# Altium footprint library PCB_CONNECTORS.PcbLib: 676 footprints (part 27 of 43)
Each footprint in its own frame and in the unit in brackets; x right, y up, seen from the top. Pads: shape width x height; smd on the part's side, far side on the other; paste and mask are expansions set on the pad; w line width, h text height; cw(c..) or ccw(c..) is an arc to the next point about the centre after c.
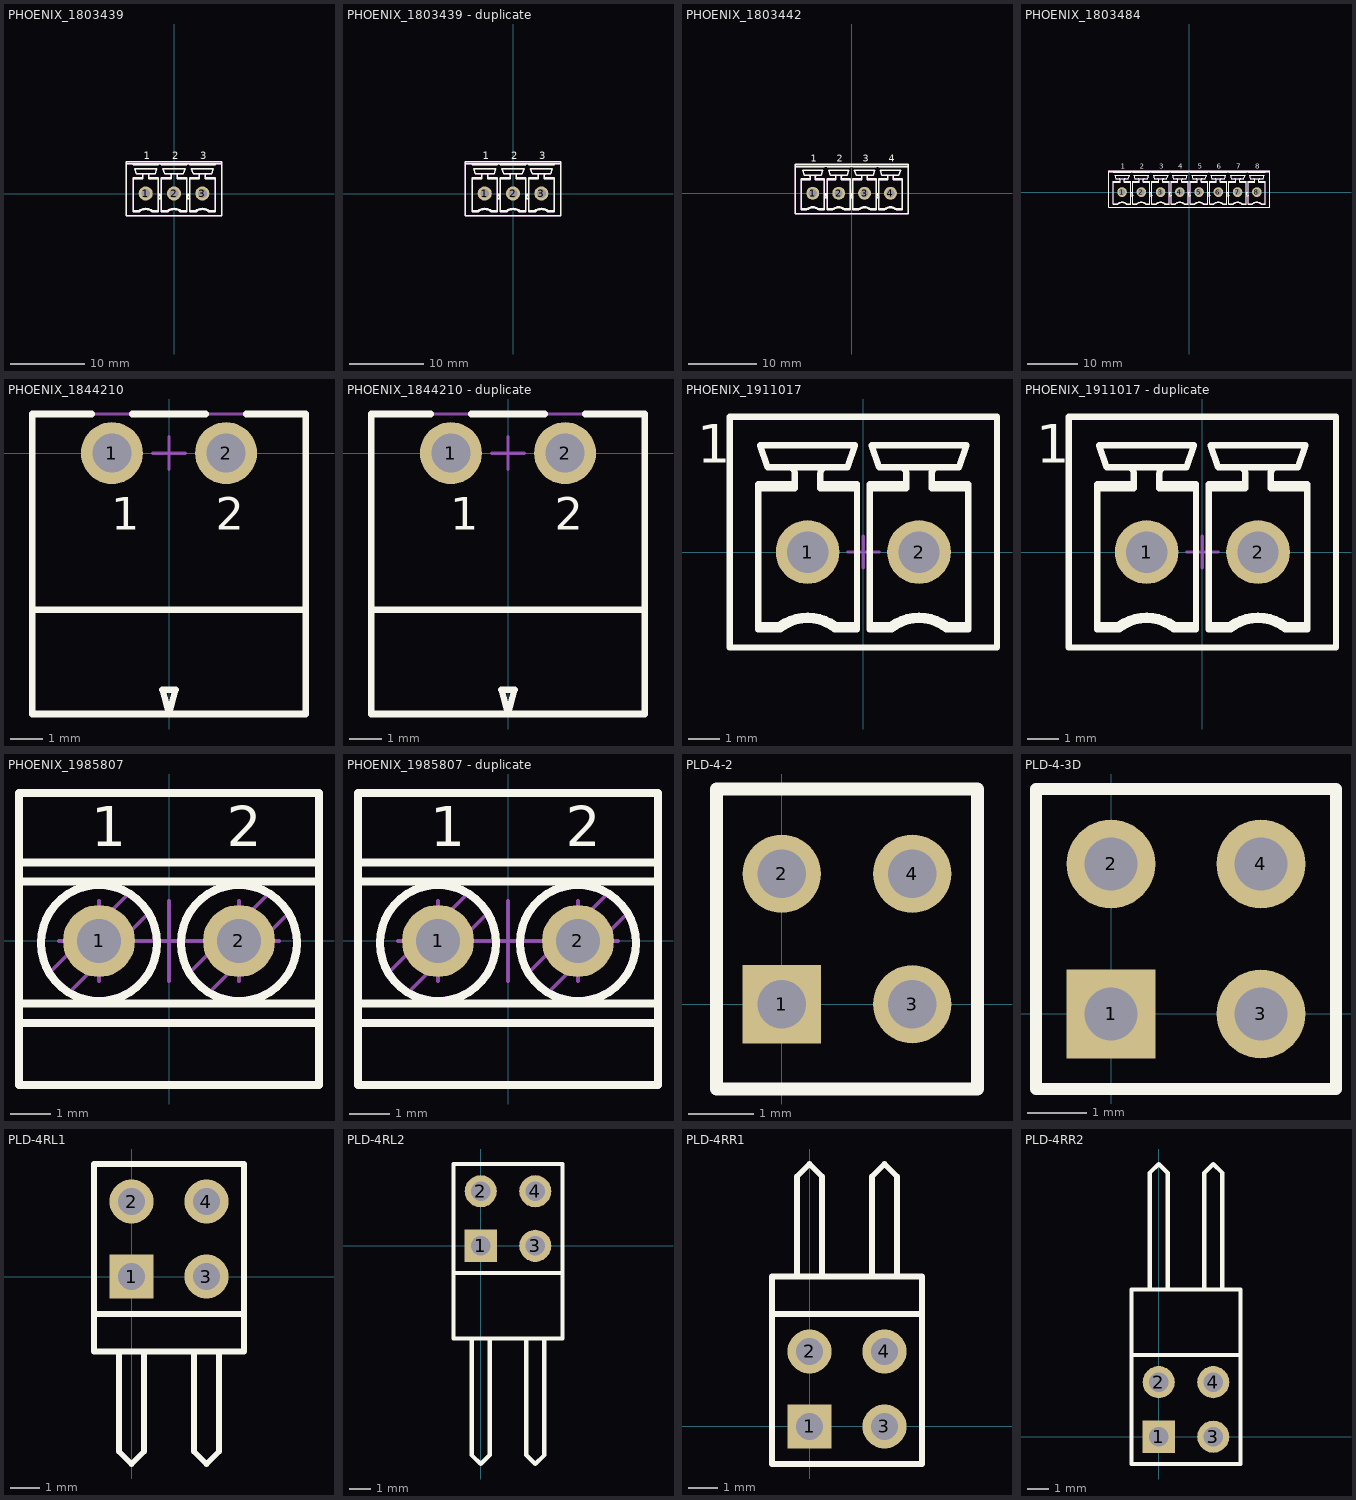
[diagram p26: the footprints below, top view; thin cyan lines are the x and y axes]

## PHOENIX_1803439 [mm] "PCB Header, 8A, 160 V, Pitch: 3.81mm, 3 Positions, MCV Serie"
height 9.2
pads (3):
  round 1.9 hole 1.2: 1(-3.81,0) 2(0,0) 3(3.81,0)
Top Overlay:
  lines w0.2: -6.41,4 6.41,4 ; -5.515,-2.3 -4.71,-2.3 ; -5.515,2 -4.21,2 -4.21,2.47 ccw(c-4.41,2.47) -4.41,2.67 ; -5.513,3.9 -5.514,3.9 ; -5.513,4 -5.514,4 -5.514,3.9 ; -4.21,2.134 -5.515,2.134 -5.515,-2.434 -4.664,-2.434 ; -3.41,2.134 -2.105,2.134 -2.105,-2.434 -2.956,-2.434 ; -3.21,2.67 ccw(c-3.21,2.47) -3.41,2.47 -3.41,2 -2.105,2 ; -2.106,4 -2.105,4 -2.105,3.9 -2.106,3.9 -5.514,3.9 ; -2.105,-2.3 -2.91,-2.3 ; -1.705,-2.3 -0.9,-2.3 ; -1.705,2 -0.4,2 -0.4,2.47 ccw(c-0.6,2.47) -0.6,2.67 ; -1.703,3.9 -1.704,3.9 ; -1.703,4 -1.704,4 -1.704,3.9 ; -0.4,2.134 -1.705,2.134 -1.705,-2.434 -0.854,-2.434 ; 0.4,2.134 1.705,2.134 1.705,-2.434 0.854,-2.434 ; 0.6,2.67 ccw(c0.6,2.47) 0.4,2.47 0.4,2 1.705,2 ; 1.704,4 1.705,4 1.705,3.9 1.704,3.9 -1.704,3.9 ; 1.705,-2.3 0.9,-2.3 ; 2.105,-2.3 2.91,-2.3 ; 2.105,2 3.41,2 3.41,2.47 ccw(c3.21,2.47) 3.21,2.67 ; 2.107,3.9 2.106,3.9 ; 2.107,4 2.106,4 2.106,3.9 ; 3.41,2.134 2.105,2.134 2.105,-2.434 2.956,-2.434 ; 4.21,2.134 5.515,2.134 5.515,-2.434 4.664,-2.434 ; 4.41,2.67 ccw(c4.41,2.47) 4.21,2.47 4.21,2 5.515,2 ; 5.514,4 5.515,4 5.515,3.9 5.514,3.9 2.106,3.9 ; 5.515,-2.3 4.71,-2.3 ; -4.71,-2.3 cw(c-3.81,-3.5) -2.91,-2.3 ; -4.71,-2.3 -4.699,-2.334 -4.687,-2.367 ccw(c3.361,0.384) -4.664,-2.434 ; -4.664,-2.434 cw(c-3.81,-3.5) -2.956,-2.434 ; -2.956,-2.434 -2.944,-2.401 -2.933,-2.367 ccw(c-11.642,0.61) -2.91,-2.3 ; -0.9,-2.3 cw(c0,-3.5) 0.9,-2.3 ; -0.9,-2.3 -0.889,-2.334 -0.877,-2.367 ccw(c7.171,0.384) -0.854,-2.434 ; -0.854,-2.434 cw(c0,-3.5) 0.854,-2.434 ; 0.854,-2.434 0.866,-2.401 0.877,-2.367 ccw(c-7.832,0.61) 0.9,-2.3 ; 2.91,-2.3 cw(c3.81,-3.5) 4.71,-2.3 ; 2.91,-2.3 2.921,-2.334 2.933,-2.367 ccw(c10.981,0.384) 2.956,-2.434 ; 2.956,-2.434 cw(c3.81,-3.5) 4.664,-2.434 ; 4.664,-2.434 4.676,-2.401 4.687,-2.367 ccw(c-4.022,0.61) 4.71,-2.3 ; -6.41,-3 -6.41,4.25 6.41,4.25 6.41,-3 -6.41,-3 ; -5.3,3.35 -5.065,2.67 -2.555,2.67 -2.32,3.35 -5.3,3.35 ; -2.093,-0.7 -1.905,0 -1.717,-0.7 -2.093,-0.7 ; -1.49,3.35 -1.255,2.67 1.255,2.67 1.49,3.35 -1.49,3.35 ; 1.717,-0.7 1.905,0 2.093,-0.7 1.717,-0.7 ; 2.32,3.35 2.555,2.67 5.065,2.67 5.3,3.35 2.32,3.35
  text "1" at -4.085,4.6 h1
  text "2" at -0.275,4.6 h1
  text "3" at 3.535,4.6 h1
Mechanical 2:
  circle w0.1: c3.81,0 r0.8
  circle w0.1: c0,0 r0.8
Mechanical 8:
  lines w0.1: -4.31,0 -3.81,0 ; -3.81,-0.5 -3.81,0 ; -3.81,0.5 -3.81,0 ; -3.31,0 -3.81,0 ; -0.5,0 0,0 ; 0,-0.5 0,0 ; 0,0.5 0,0 ; 0.5,0 0,0 ; 3.31,0 3.81,0 ; 3.81,-0.5 3.81,0 ; 3.81,0.5 3.81,0 ; 4.31,0 3.81,0
Mechanical 14:
  lines w0.1: -6.41,4 6.41,4 ; -5.515,-2.3 -4.71,-2.3 ; -5.515,2 -4.21,2 -4.21,2.47 ccw(c-4.41,2.47) -4.41,2.67 ; -5.513,3.9 -5.514,3.9 ; -5.513,4 -5.514,4 -5.514,3.9 ; -4.21,2.134 -5.515,2.134 -5.515,-2.434 -4.664,-2.434 ; -3.41,2.134 -2.105,2.134 -2.105,-2.434 -2.956,-2.434 ; -3.21,2.67 ccw(c-3.21,2.47) -3.41,2.47 -3.41,2 -2.105,2 ; -2.106,4 -2.105,4 -2.105,3.9 -2.106,3.9 -5.514,3.9 ; -2.105,-2.3 -2.91,-2.3 ; -1.705,-2.3 -0.9,-2.3 ; -1.705,2 -0.4,2 -0.4,2.47 ccw(c-0.6,2.47) -0.6,2.67 ; -1.703,3.9 -1.704,3.9 ; -1.703,4 -1.704,4 -1.704,3.9 ; -0.4,2.134 -1.705,2.134 -1.705,-2.434 -0.854,-2.434 ; 0.4,2.134 1.705,2.134 1.705,-2.434 0.854,-2.434 ; 0.6,2.67 ccw(c0.6,2.47) 0.4,2.47 0.4,2 1.705,2 ; 1.704,4 1.705,4 1.705,3.9 1.704,3.9 -1.704,3.9 ; 1.705,-2.3 0.9,-2.3 ; 2.105,-2.3 2.91,-2.3 ; 2.105,2 3.41,2 3.41,2.47 ccw(c3.21,2.47) 3.21,2.67 ; 2.107,3.9 2.106,3.9 ; 2.107,4 2.106,4 2.106,3.9 ; 3.41,2.134 2.105,2.134 2.105,-2.434 2.956,-2.434 ; 4.21,2.134 5.515,2.134 5.515,-2.434 4.664,-2.434 ; 4.41,2.67 ccw(c4.41,2.47) 4.21,2.47 4.21,2 5.515,2 ; 5.514,4 5.515,4 5.515,3.9 5.514,3.9 2.106,3.9 ; 5.515,-2.3 4.71,-2.3 ; -4.71,-2.3 cw(c-3.81,-3.5) -2.91,-2.3 ; -4.71,-2.3 -4.699,-2.334 -4.687,-2.367 ccw(c3.361,0.384) -4.664,-2.434 ; -4.664,-2.434 cw(c-3.81,-3.5) -2.956,-2.434 ; -2.956,-2.434 -2.944,-2.401 -2.933,-2.367 ccw(c-11.642,0.61) -2.91,-2.3 ; -0.9,-2.3 cw(c0,-3.5) 0.9,-2.3 ; -0.9,-2.3 -0.889,-2.334 -0.877,-2.367 ccw(c7.171,0.384) -0.854,-2.434 ; -0.854,-2.434 cw(c0,-3.5) 0.854,-2.434 ; 0.854,-2.434 0.866,-2.401 0.877,-2.367 ccw(c-7.832,0.61) 0.9,-2.3 ; 2.91,-2.3 cw(c3.81,-3.5) 4.71,-2.3 ; 2.91,-2.3 2.921,-2.334 2.933,-2.367 ccw(c10.981,0.384) 2.956,-2.434 ; 2.956,-2.434 cw(c3.81,-3.5) 4.664,-2.434 ; 4.664,-2.434 4.676,-2.401 4.687,-2.367 ccw(c-4.022,0.61) 4.71,-2.3 ; -6.41,-3 -6.41,4.25 6.41,4.25 6.41,-3 -6.41,-3 ; -5.3,3.35 -5.065,2.67 -2.555,2.67 -2.32,3.35 -5.3,3.35 ; -4.31,-0.625 ccw(c-3.81,0) -4.31,0.625 -4.31,-0.624 ; -4.21,-0.4 -3.41,-0.4 -3.41,0.4 -4.21,0.4 -4.21,-0.4 ; -2.093,-0.7 -1.905,0 -1.717,-0.7 -2.093,-0.7 ; -1.49,3.35 -1.255,2.67 1.255,2.67 1.49,3.35 -1.49,3.35 ; -0.4,-0.4 0.4,-0.4 0.4,0.4 -0.4,0.4 -0.4,-0.4 ; 1.717,-0.7 1.905,0 2.093,-0.7 1.717,-0.7 ; 2.32,3.35 2.555,2.67 5.065,2.67 5.3,3.35 2.32,3.35 ; 3.41,-0.4 4.21,-0.4 4.21,0.4 3.41,0.4 3.41,-0.4
3D body "PHOENIX_1803439.stp": height 9.2, standoff -3.4, extent -6.41,-3 6.41,4.25

## PHOENIX_1803439 - duplicate [mm] "PCB Header, 8A, 160 V, Pitch: 3.81mm, 3 Positions, MCV Serie"
height 9.2
pads (3):
  round 1.9 hole 1.2: 1(-3.81,0) 2(0,0) 3(3.81,0)
Top Overlay:
  lines w0.2: -6.41,4 6.41,4 ; -5.515,-2.3 -4.71,-2.3 ; -5.515,2 -4.21,2 -4.21,2.47 ccw(c-4.41,2.47) -4.41,2.67 ; -5.513,3.9 -5.514,3.9 ; -5.513,4 -5.514,4 -5.514,3.9 ; -4.21,2.134 -5.515,2.134 -5.515,-2.434 -4.664,-2.434 ; -3.41,2.134 -2.105,2.134 -2.105,-2.434 -2.956,-2.434 ; -3.21,2.67 ccw(c-3.21,2.47) -3.41,2.47 -3.41,2 -2.105,2 ; -2.106,4 -2.105,4 -2.105,3.9 -2.106,3.9 -5.514,3.9 ; -2.105,-2.3 -2.91,-2.3 ; -1.705,-2.3 -0.9,-2.3 ; -1.705,2 -0.4,2 -0.4,2.47 ccw(c-0.6,2.47) -0.6,2.67 ; -1.703,3.9 -1.704,3.9 ; -1.703,4 -1.704,4 -1.704,3.9 ; -0.4,2.134 -1.705,2.134 -1.705,-2.434 -0.854,-2.434 ; 0.4,2.134 1.705,2.134 1.705,-2.434 0.854,-2.434 ; 0.6,2.67 ccw(c0.6,2.47) 0.4,2.47 0.4,2 1.705,2 ; 1.704,4 1.705,4 1.705,3.9 1.704,3.9 -1.704,3.9 ; 1.705,-2.3 0.9,-2.3 ; 2.105,-2.3 2.91,-2.3 ; 2.105,2 3.41,2 3.41,2.47 ccw(c3.21,2.47) 3.21,2.67 ; 2.107,3.9 2.106,3.9 ; 2.107,4 2.106,4 2.106,3.9 ; 3.41,2.134 2.105,2.134 2.105,-2.434 2.956,-2.434 ; 4.21,2.134 5.515,2.134 5.515,-2.434 4.664,-2.434 ; 4.41,2.67 ccw(c4.41,2.47) 4.21,2.47 4.21,2 5.515,2 ; 5.514,4 5.515,4 5.515,3.9 5.514,3.9 2.106,3.9 ; 5.515,-2.3 4.71,-2.3 ; -4.71,-2.3 cw(c-3.81,-3.5) -2.91,-2.3 ; -4.71,-2.3 -4.699,-2.334 -4.687,-2.367 ccw(c3.361,0.384) -4.664,-2.434 ; -4.664,-2.434 cw(c-3.81,-3.5) -2.956,-2.434 ; -2.956,-2.434 -2.944,-2.401 -2.933,-2.367 ccw(c-11.642,0.61) -2.91,-2.3 ; -0.9,-2.3 cw(c0,-3.5) 0.9,-2.3 ; -0.9,-2.3 -0.889,-2.334 -0.877,-2.367 ccw(c7.171,0.384) -0.854,-2.434 ; -0.854,-2.434 cw(c0,-3.5) 0.854,-2.434 ; 0.854,-2.434 0.866,-2.401 0.877,-2.367 ccw(c-7.832,0.61) 0.9,-2.3 ; 2.91,-2.3 cw(c3.81,-3.5) 4.71,-2.3 ; 2.91,-2.3 2.921,-2.334 2.933,-2.367 ccw(c10.981,0.384) 2.956,-2.434 ; 2.956,-2.434 cw(c3.81,-3.5) 4.664,-2.434 ; 4.664,-2.434 4.676,-2.401 4.687,-2.367 ccw(c-4.022,0.61) 4.71,-2.3 ; -6.41,-3 -6.41,4.25 6.41,4.25 6.41,-3 -6.41,-3 ; -5.3,3.35 -5.065,2.67 -2.555,2.67 -2.32,3.35 -5.3,3.35 ; -2.093,-0.7 -1.905,0 -1.717,-0.7 -2.093,-0.7 ; -1.49,3.35 -1.255,2.67 1.255,2.67 1.49,3.35 -1.49,3.35 ; 1.717,-0.7 1.905,0 2.093,-0.7 1.717,-0.7 ; 2.32,3.35 2.555,2.67 5.065,2.67 5.3,3.35 2.32,3.35
  text "1" at -4.085,4.6 h1
  text "2" at -0.275,4.6 h1
  text "3" at 3.535,4.6 h1
Mechanical 2:
  circle w0.1: c3.81,0 r0.8
  circle w0.1: c0,0 r0.8
Mechanical 8:
  lines w0.1: -4.31,0 -3.81,0 ; -3.81,-0.5 -3.81,0 ; -3.81,0.5 -3.81,0 ; -3.31,0 -3.81,0 ; -0.5,0 0,0 ; 0,-0.5 0,0 ; 0,0.5 0,0 ; 0.5,0 0,0 ; 3.31,0 3.81,0 ; 3.81,-0.5 3.81,0 ; 3.81,0.5 3.81,0 ; 4.31,0 3.81,0
Mechanical 14:
  lines w0.1: -6.41,4 6.41,4 ; -5.515,-2.3 -4.71,-2.3 ; -5.515,2 -4.21,2 -4.21,2.47 ccw(c-4.41,2.47) -4.41,2.67 ; -5.513,3.9 -5.514,3.9 ; -5.513,4 -5.514,4 -5.514,3.9 ; -4.21,2.134 -5.515,2.134 -5.515,-2.434 -4.664,-2.434 ; -3.41,2.134 -2.105,2.134 -2.105,-2.434 -2.956,-2.434 ; -3.21,2.67 ccw(c-3.21,2.47) -3.41,2.47 -3.41,2 -2.105,2 ; -2.106,4 -2.105,4 -2.105,3.9 -2.106,3.9 -5.514,3.9 ; -2.105,-2.3 -2.91,-2.3 ; -1.705,-2.3 -0.9,-2.3 ; -1.705,2 -0.4,2 -0.4,2.47 ccw(c-0.6,2.47) -0.6,2.67 ; -1.703,3.9 -1.704,3.9 ; -1.703,4 -1.704,4 -1.704,3.9 ; -0.4,2.134 -1.705,2.134 -1.705,-2.434 -0.854,-2.434 ; 0.4,2.134 1.705,2.134 1.705,-2.434 0.854,-2.434 ; 0.6,2.67 ccw(c0.6,2.47) 0.4,2.47 0.4,2 1.705,2 ; 1.704,4 1.705,4 1.705,3.9 1.704,3.9 -1.704,3.9 ; 1.705,-2.3 0.9,-2.3 ; 2.105,-2.3 2.91,-2.3 ; 2.105,2 3.41,2 3.41,2.47 ccw(c3.21,2.47) 3.21,2.67 ; 2.107,3.9 2.106,3.9 ; 2.107,4 2.106,4 2.106,3.9 ; 3.41,2.134 2.105,2.134 2.105,-2.434 2.956,-2.434 ; 4.21,2.134 5.515,2.134 5.515,-2.434 4.664,-2.434 ; 4.41,2.67 ccw(c4.41,2.47) 4.21,2.47 4.21,2 5.515,2 ; 5.514,4 5.515,4 5.515,3.9 5.514,3.9 2.106,3.9 ; 5.515,-2.3 4.71,-2.3 ; -4.71,-2.3 cw(c-3.81,-3.5) -2.91,-2.3 ; -4.71,-2.3 -4.699,-2.334 -4.687,-2.367 ccw(c3.361,0.384) -4.664,-2.434 ; -4.664,-2.434 cw(c-3.81,-3.5) -2.956,-2.434 ; -2.956,-2.434 -2.944,-2.401 -2.933,-2.367 ccw(c-11.642,0.61) -2.91,-2.3 ; -0.9,-2.3 cw(c0,-3.5) 0.9,-2.3 ; -0.9,-2.3 -0.889,-2.334 -0.877,-2.367 ccw(c7.171,0.384) -0.854,-2.434 ; -0.854,-2.434 cw(c0,-3.5) 0.854,-2.434 ; 0.854,-2.434 0.866,-2.401 0.877,-2.367 ccw(c-7.832,0.61) 0.9,-2.3 ; 2.91,-2.3 cw(c3.81,-3.5) 4.71,-2.3 ; 2.91,-2.3 2.921,-2.334 2.933,-2.367 ccw(c10.981,0.384) 2.956,-2.434 ; 2.956,-2.434 cw(c3.81,-3.5) 4.664,-2.434 ; 4.664,-2.434 4.676,-2.401 4.687,-2.367 ccw(c-4.022,0.61) 4.71,-2.3 ; -6.41,-3 -6.41,4.25 6.41,4.25 6.41,-3 -6.41,-3 ; -5.3,3.35 -5.065,2.67 -2.555,2.67 -2.32,3.35 -5.3,3.35 ; -4.31,-0.625 ccw(c-3.81,0) -4.31,0.625 -4.31,-0.624 ; -4.21,-0.4 -3.41,-0.4 -3.41,0.4 -4.21,0.4 -4.21,-0.4 ; -2.093,-0.7 -1.905,0 -1.717,-0.7 -2.093,-0.7 ; -1.49,3.35 -1.255,2.67 1.255,2.67 1.49,3.35 -1.49,3.35 ; -0.4,-0.4 0.4,-0.4 0.4,0.4 -0.4,0.4 -0.4,-0.4 ; 1.717,-0.7 1.905,0 2.093,-0.7 1.717,-0.7 ; 2.32,3.35 2.555,2.67 5.065,2.67 5.3,3.35 2.32,3.35 ; 3.41,-0.4 4.21,-0.4 4.21,0.4 3.41,0.4 3.41,-0.4
3D body "PHOENIX_1803439.stp": height 9.2, standoff -3.4, extent -6.41,-3 6.41,4.25

## PHOENIX_1803442 [mm] "PCB Header, 8A, 160 V, Pitch: 3.81mm, 4 Positions, MCV Serie"
height 9.2
pads (4):
  round 1.9 hole 1.2: 1(-5.715,0) 2(-1.905,0) 3(1.905,0) 4(5.715,0)
Top Overlay:
  lines w0.2: -8.315,3.9 -4.011,3.9 -4.01,3.9 -4.01,4 -4.011,4 ; -8.315,4 8.315,4 ; -7.42,-2.3 -6.615,-2.3 ; -7.42,2 -6.115,2 -6.115,2.47 ccw(c-6.315,2.47) -6.315,2.67 ; -6.115,2.134 -7.42,2.134 -7.42,-2.434 -6.569,-2.434 ; -5.315,2.134 -4.01,2.134 -4.01,-2.434 -4.861,-2.434 ; -5.115,2.67 ccw(c-5.115,2.47) -5.315,2.47 -5.315,2 -4.01,2 ; -4.01,-2.3 -4.815,-2.3 ; -3.61,-2.3 -2.805,-2.3 ; -3.61,2 -2.305,2 -2.305,2.47 ccw(c-2.505,2.47) -2.505,2.67 ; -3.609,4 -3.61,4 -3.61,3.9 -3.609,3.9 -0.201,3.9 -0.2,3.9 -0.2,4 -0.201,4 ; -2.305,2.134 -3.61,2.134 -3.61,-2.434 -2.759,-2.434 ; -1.505,2.134 -0.2,2.134 -0.2,-2.434 -1.051,-2.434 ; -1.305,2.67 ccw(c-1.305,2.47) -1.505,2.47 -1.505,2 -0.2,2 ; -0.2,-2.3 -1.005,-2.3 ; 0.2,-2.3 1.005,-2.3 ; 0.2,2 1.505,2 1.505,2.47 ccw(c1.305,2.47) 1.305,2.67 ; 0.201,4 0.2,4 0.2,3.9 0.201,3.9 3.609,3.9 3.61,3.9 3.61,4 3.609,4 ; 1.505,2.134 0.2,2.134 0.2,-2.434 1.051,-2.434 ; 2.305,2.134 3.61,2.134 3.61,-2.434 2.759,-2.434 ; 2.505,2.67 ccw(c2.505,2.47) 2.305,2.47 2.305,2 3.61,2 ; 3.61,-2.3 2.805,-2.3 ; 4.01,-2.3 4.815,-2.3 ; 4.01,2 5.315,2 5.315,2.47 ccw(c5.115,2.47) 5.115,2.67 ; 4.011,4 4.01,4 4.01,3.9 4.011,3.9 8.315,3.9 ; 5.315,2.134 4.01,2.134 4.01,-2.434 4.861,-2.434 ; 6.115,2.134 7.42,2.134 7.42,-2.434 6.569,-2.434 ; 6.315,2.67 ccw(c6.315,2.47) 6.115,2.47 6.115,2 7.42,2 ; 7.42,-2.3 6.615,-2.3 ; -6.615,-2.3 cw(c-5.715,-3.5) -4.815,-2.3 ; -6.615,-2.3 -6.604,-2.334 -6.592,-2.367 ccw(c1.456,0.384) -6.569,-2.434 ; -6.569,-2.434 cw(c-5.715,-3.5) -4.861,-2.434 ; -4.861,-2.434 -4.849,-2.401 -4.838,-2.367 ccw(c-13.547,0.61) -4.815,-2.3 ; -2.805,-2.3 cw(c-1.905,-3.5) -1.005,-2.3 ; -2.805,-2.3 -2.794,-2.334 -2.782,-2.367 ccw(c5.266,0.384) -2.759,-2.434 ; -2.759,-2.434 cw(c-1.905,-3.5) -1.051,-2.434 ; -1.051,-2.434 -1.039,-2.401 -1.028,-2.367 ccw(c-9.737,0.61) -1.005,-2.3 ; 1.005,-2.3 cw(c1.905,-3.5) 2.805,-2.3 ; 1.005,-2.3 1.016,-2.334 1.028,-2.367 ccw(c9.05,0.375) 1.051,-2.434 ; 1.051,-2.434 cw(c1.905,-3.5) 2.759,-2.434 ; 2.759,-2.434 2.771,-2.401 2.782,-2.367 ccw(c-5.968,0.624) 2.805,-2.3 ; 4.815,-2.3 cw(c5.715,-3.5) 6.615,-2.3 ; 4.815,-2.3 4.826,-2.334 4.838,-2.367 ccw(c12.886,0.384) 4.861,-2.434 ; 4.861,-2.434 cw(c5.715,-3.5) 6.569,-2.434 ; 6.569,-2.434 6.581,-2.401 6.592,-2.367 ccw(c-2.117,0.61) 6.615,-2.3 ; -8.315,-3 -8.315,4.25 8.315,4.25 8.315,-3 -8.315,-3 ; -7.205,3.35 -6.97,2.67 -4.46,2.67 -4.225,3.35 -7.205,3.35 ; -3.998,-0.7 -3.81,0 -3.622,-0.7 -3.998,-0.7 ; -3.395,3.35 -3.16,2.67 -0.65,2.67 -0.415,3.35 -3.395,3.35 ; -0.188,-0.7 0,0 0.188,-0.7 -0.188,-0.7 ; 0.415,3.35 0.65,2.67 3.16,2.67 3.395,3.35 0.415,3.35 ; 3.622,-0.7 3.81,0 3.998,-0.7 3.622,-0.7 ; 4.225,3.35 7.205,3.35 6.97,2.67 4.46,2.67 4.225,3.35
  text "4" at 5.44,4.6 h1
  text "3" at 1.63,4.6 h1
  text "2" at -2.18,4.6 h1
  text "1" at -5.99,4.6 h1
Mechanical 8:
  lines w0.1: -6.215,0 -5.715,0 ; -5.715,-0.5 -5.715,0 ; -5.715,0.5 -5.715,0 ; -5.215,0 -5.715,0 ; -2.405,0 -1.905,0 ; -1.905,-0.5 -1.905,0 ; -1.905,0.5 -1.905,0 ; -1.405,0 -1.905,0 ; -0.5,0 0,0 ; 0,-0.5 0,0 ; 0,0.5 0,0 ; 0.5,0 0,0 ; 1.405,0 1.905,0 ; 1.905,-0.5 1.905,0 ; 1.905,0.5 1.905,0 ; 2.405,0 1.905,0 ; 5.215,0 5.715,0 ; 5.715,-0.5 5.715,0 ; 5.715,0.5 5.715,0 ; 6.215,0 5.715,0
Mechanical 14:
  drawing of 161 lines, arcs and shapes, not listed
3D body "PHOENIX_1803442.stp": height 9.2, standoff -3.4, extent -8.315,-3 8.315,4.25

## PHOENIX_1803484 [mm] "PCB Header, 8A, 160 V, Pitch: 3.81mm, 8 Positions, MCV Serie"
height 9.2
pads (8):
  round 1.9 hole 1.2: 1(-13.335,0) 2(-9.525,0) 3(-5.715,0) 4(-1.905,0) 5(1.905,0) 6(5.715,0) 7(9.525,0) 8(13.335,0)
Top Overlay:
  drawing of 290 lines, arcs and shapes, not listed
  text "8" at 13.06,4.6 h1
  text "7" at 9.25,4.6 h1
  text "1" at -13.61,4.6 h1
  text "2" at -9.8,4.6 h1
  text "3" at -5.99,4.6 h1
  text "4" at -2.18,4.6 h1
  text "5" at 1.63,4.6 h1
  text "6" at 5.44,4.6 h1
Mechanical 8:
  lines w0.1: -13.835,0 -13.335,0 ; -13.335,-0.5 -13.335,0 ; -13.335,0.5 -13.335,0 ; -12.835,0 -13.335,0 ; -10.025,0 -9.525,0 ; -9.525,-0.5 -9.525,0 ; -9.525,0.5 -9.525,0 ; -9.025,0 -9.525,0 ; -6.215,0 -5.715,0 ; -5.715,-0.5 -5.715,0 ; -5.715,0.5 -5.715,0 ; -5.215,0 -5.715,0 ; -2.405,0 -1.905,0 ; -1.905,-0.5 -1.905,0 ; -1.905,0.5 -1.905,0 ; -1.405,0 -1.905,0 ; -0.5,0 0,0 ; 0,-0.5 0,0 ; 0,0.5 0,0 ; 0.5,0 0,0 ; 1.405,0 1.905,0 ; 1.905,-0.5 1.905,0 ; 1.905,0.5 1.905,0 ; 2.405,0 1.905,0 ; 5.215,0 5.715,0 ; 5.715,-0.5 5.715,0 ; 5.715,0.5 5.715,0 ; 6.215,0 5.715,0 ; 9.025,0 9.525,0 ; 9.525,-0.5 9.525,0 ; 9.525,0.5 9.525,0 ; 10.025,0 9.525,0 ; 12.835,0 13.335,0 ; 13.335,-0.5 13.335,0 ; 13.335,0.5 13.335,0 ; 13.835,0 13.335,0
Mechanical 14:
  drawing of 492 lines, arcs and shapes, not listed
3D body "PHOENIX_1803484.stp": height 9.2, standoff -3.4, extent -15.935,-3 15.935,4.25

## PHOENIX_1844210 [mm] "PHOENIX MC Serie, Pitch 3.5mm, 8A, 160V, 2 Positions Header"
height 8.1
pads (2):
  round 1.9 hole 1.2: 1(-1.75,0) 2(1.75,0)
Top Overlay:
  lines w0.2: -4.2,-4.8 4.2,-4.8 ; -2.368,1.2 -4.2,1.2 -4.2,-8 4.2,-8 4.2,1.2 2.368,1.2 ; -1.132,1.2 1.132,1.2 ; -0.201,-7.25 0,-8 0.201,-7.25 -0.201,-7.25
  text "1" at -1.767,-2.35 h1
  text "2" at 1.433,-2.35 h1
Mechanical 8:
  lines w0.1: -2.25,0 -1.75,0 ; -1.75,-0.5 -1.75,0 ; -1.75,0.5 -1.75,0 ; -1.25,0 -1.75,0 ; -0.5,0 0,0 ; 0,-0.5 0,0 ; 0,0.5 0,0 ; 0.5,0 0,0 ; 1.25,0 1.75,0 ; 1.75,-0.5 1.75,0 ; 1.75,0.5 1.75,0 ; 2.25,0 1.75,0
Mechanical 14:
  lines w0.1: -4.2,-4.8 4.2,-4.8 ; -4.2,-8 4.2,-8 4.2,1.2 -4.2,1.2 -4.2,-8 ; -0.201,-7.25 0,-8 0.201,-7.25 -0.201,-7.25
3D body "PHOENIX_1844210.stp": height 7.25, standoff -3.4, extent -4.2,-8 4.2,1.2

## PHOENIX_1844210 - duplicate [mm] "PHOENIX MC Serie, Pitch 3.5mm, 8A, 160V, 2 Positions Header"
height 8.1
pads (2):
  round 1.9 hole 1.2: 1(-1.75,0) 2(1.75,0)
Top Overlay:
  lines w0.2: -4.2,-4.8 4.2,-4.8 ; -2.368,1.2 -4.2,1.2 -4.2,-8 4.2,-8 4.2,1.2 2.368,1.2 ; -1.132,1.2 1.132,1.2 ; -0.201,-7.25 0,-8 0.201,-7.25 -0.201,-7.25
  text "1" at -1.767,-2.35 h1
  text "2" at 1.433,-2.35 h1
Mechanical 8:
  lines w0.1: -2.25,0 -1.75,0 ; -1.75,-0.5 -1.75,0 ; -1.75,0.5 -1.75,0 ; -1.25,0 -1.75,0 ; -0.5,0 0,0 ; 0,-0.5 0,0 ; 0,0.5 0,0 ; 0.5,0 0,0 ; 1.25,0 1.75,0 ; 1.75,-0.5 1.75,0 ; 1.75,0.5 1.75,0 ; 2.25,0 1.75,0
Mechanical 14:
  lines w0.1: -4.2,-4.8 4.2,-4.8 ; -4.2,-8 4.2,-8 4.2,1.2 -4.2,1.2 -4.2,-8 ; -0.201,-7.25 0,-8 0.201,-7.25 -0.201,-7.25
3D body "PHOENIX_1844210.stp": height 7.25, standoff -3.4, extent -4.2,-8 4.2,1.2

## PHOENIX_1911017 [mm] "8A, 160V, Pitch 3.5mm, 2 Positions Press-in Header"
height 9.2
pads (2):
  round 2 hole 1.3: 1(-1.75,0) 2(1.75,0)
Top Overlay:
  lines w0.2: -3.3,-2.3 -2.65,-2.3 ; -3.3,2 -2.15,2 -2.15,2.47 ccw(c-2.35,2.47) -2.35,2.67 ; -2.15,2.134 -3.3,2.134 -3.3,-2.434 -2.604,-2.434 ; -1.35,2.134 -0.2,2.134 -0.2,-2.434 -0.896,-2.434 ; -1.15,2.67 ccw(c-1.15,2.47) -1.35,2.47 -1.35,2 -0.2,2 ; -0.2,-2.3 -0.85,-2.3 ; 0.2,-2.3 0.85,-2.3 ; 0.2,2 1.35,2 1.35,2.47 ccw(c1.15,2.47) 1.15,2.67 ; 1.35,2.134 0.2,2.134 0.2,-2.434 0.896,-2.434 ; 2.15,2.134 3.3,2.134 3.3,-2.434 2.604,-2.434 ; 2.35,2.67 ccw(c2.35,2.47) 2.15,2.47 2.15,2 3.3,2 ; 3.3,-2.3 2.65,-2.3 ; -2.65,-2.3 cw(c-1.75,-3.5) -0.85,-2.3 ; -2.65,-2.3 -2.604,-2.434 ; -2.604,-2.434 cw(c-1.75,-3.5) -0.896,-2.434 ; -0.896,-2.434 -0.85,-2.3 ; 0.85,-2.3 cw(c1.75,-3.5) 2.65,-2.3 ; 0.85,-2.3 0.896,-2.434 ; 0.896,-2.434 cw(c1.75,-3.5) 2.604,-2.434 ; 2.604,-2.434 2.65,-2.3 ; -4.2,-3 -4.2,4.25 4.2,4.25 4.2,-3 -4.2,-3 ; -3.24,3.35 -3.005,2.67 -0.495,2.67 -0.26,3.35 -3.24,3.35 ; 0.26,3.35 0.495,2.67 3.005,2.67 3.24,3.35 0.26,3.35
  text "1" at -5.225,2.8 h1.2
Mechanical 8:
  lines w0.1: -2.25,0 -1.75,0 ; -1.75,-0.5 -1.75,0 ; -1.75,0.5 -1.75,0 ; -1.25,0 -1.75,0 ; -0.5,0 0,0 ; 0,-0.5 0,0 ; 0,0.5 0,0 ; 0.5,0 0,0 ; 1.25,0 1.75,0 ; 1.75,-0.5 1.75,0 ; 1.75,0.5 1.75,0 ; 2.25,0 1.75,0
Mechanical 14:
  circle w0.1: c1.75,0 r0.8
  lines w0.1: -3.3,-2.3 -2.65,-2.3 ; -3.3,2 -2.15,2 -2.15,2.47 ccw(c-2.35,2.47) -2.35,2.67 ; -2.15,2.134 -3.3,2.134 -3.3,-2.434 -2.604,-2.434 ; -1.618,-0.132 -1.35,-0.4 ; -1.35,2.134 -0.2,2.134 -0.2,-2.434 -0.896,-2.434 ; -1.15,2.67 ccw(c-1.15,2.47) -1.35,2.47 -1.35,2 -0.2,2 ; -0.2,-2.3 -0.85,-2.3 ; 0.2,-2.3 0.85,-2.3 ; 0.2,2 1.35,2 1.35,2.47 ccw(c1.15,2.47) 1.15,2.67 ; 1.35,2.134 0.2,2.134 0.2,-2.434 0.896,-2.434 ; 1.882,-0.132 2.15,-0.4 ; 2.15,2.134 3.3,2.134 3.3,-2.434 2.604,-2.434 ; 2.35,2.67 ccw(c2.35,2.47) 2.15,2.47 2.15,2 3.3,2 ; 3.3,-2.3 2.65,-2.3 ; -2.65,-2.3 cw(c-1.75,-3.5) -0.85,-2.3 ; -2.65,-2.3 -2.604,-2.434 ; -2.604,-2.434 cw(c-1.75,-3.5) -0.896,-2.434 ; -2.15,-0.4 -1.89,-0.14 ; -2.15,-0.4 -2.15,0.4 ; -2.15,-0.4 -1.35,-0.4 ; -2.15,0.4 -1.89,0.14 ; -2.15,0.4 -1.35,0.4 ; -1.89,-0.14 -1.61,-0.14 -1.61,0.14 ; -1.89,-0.14 -1.89,0.14 ; -1.89,0.14 -1.61,0.14 ; -1.61,0.14 -1.35,0.4 ; -1.35,-0.4 -1.35,0.4 ; -0.896,-2.434 -0.85,-2.3 ; 0.85,-2.3 cw(c1.75,-3.5) 2.65,-2.3 ; 0.85,-2.3 0.896,-2.434 ; 0.896,-2.434 cw(c1.75,-3.5) 2.604,-2.434 ; 1.35,-0.4 1.61,-0.14 ; 1.35,-0.4 1.35,0.4 ; 1.35,-0.4 2.15,-0.4 ; 1.35,0.4 1.61,0.14 ; 1.35,0.4 2.15,0.4 ; 1.61,-0.14 1.89,-0.14 1.89,0.14 ; 1.61,-0.14 1.61,0.14 ; 1.61,0.14 1.89,0.14 ; 1.89,0.14 2.15,0.4 ; 2.15,-0.4 2.15,0.4 ; 2.604,-2.434 2.65,-2.3 ; -4.2,-3 -4.2,4.25 4.2,4.25 4.2,-3 -4.2,-3 ; -3.24,3.35 -3.005,2.67 -0.495,2.67 -0.26,3.35 -3.24,3.35 ; -2.25,-0.625 ccw(c-1.75,0) -2.25,0.625 -2.25,-0.624 ; 0.26,3.35 0.495,2.67 3.005,2.67 3.24,3.35 0.26,3.35
  text "1" at -5.225,2.8 h1.2
Drill Drawing:
  lines w0.1: -4.2,-3 4.2,-3 4.2,4.25 -4.2,4.25 -4.2,-3
  text "diam. 1.3mm" at -3.7,3.025 h0.8
  text "PRESS-FIT" at -2.925,-2.575 h0.8
  text "+0.09 -0.06" at -3.65,1.725 h0.8
3D body "PHOENIX_1911017.stp": height 9.2, standoff -3.8, extent -4.2,-3 4.2,4.25

## PHOENIX_1911017 - duplicate [mm] "8A, 160V, Pitch 3.5mm, 2 Positions Press-in Header"
height 9.2
pads (2):
  round 2 hole 1.3: 1(-1.75,0) 2(1.75,0)
Top Overlay:
  lines w0.2: -3.3,-2.3 -2.65,-2.3 ; -3.3,2 -2.15,2 -2.15,2.47 ccw(c-2.35,2.47) -2.35,2.67 ; -2.15,2.134 -3.3,2.134 -3.3,-2.434 -2.604,-2.434 ; -1.35,2.134 -0.2,2.134 -0.2,-2.434 -0.896,-2.434 ; -1.15,2.67 ccw(c-1.15,2.47) -1.35,2.47 -1.35,2 -0.2,2 ; -0.2,-2.3 -0.85,-2.3 ; 0.2,-2.3 0.85,-2.3 ; 0.2,2 1.35,2 1.35,2.47 ccw(c1.15,2.47) 1.15,2.67 ; 1.35,2.134 0.2,2.134 0.2,-2.434 0.896,-2.434 ; 2.15,2.134 3.3,2.134 3.3,-2.434 2.604,-2.434 ; 2.35,2.67 ccw(c2.35,2.47) 2.15,2.47 2.15,2 3.3,2 ; 3.3,-2.3 2.65,-2.3 ; -2.65,-2.3 cw(c-1.75,-3.5) -0.85,-2.3 ; -2.65,-2.3 -2.604,-2.434 ; -2.604,-2.434 cw(c-1.75,-3.5) -0.896,-2.434 ; -0.896,-2.434 -0.85,-2.3 ; 0.85,-2.3 cw(c1.75,-3.5) 2.65,-2.3 ; 0.85,-2.3 0.896,-2.434 ; 0.896,-2.434 cw(c1.75,-3.5) 2.604,-2.434 ; 2.604,-2.434 2.65,-2.3 ; -4.2,-3 -4.2,4.25 4.2,4.25 4.2,-3 -4.2,-3 ; -3.24,3.35 -3.005,2.67 -0.495,2.67 -0.26,3.35 -3.24,3.35 ; 0.26,3.35 0.495,2.67 3.005,2.67 3.24,3.35 0.26,3.35
  text "1" at -5.225,2.8 h1.2
Mechanical 8:
  lines w0.1: -2.25,0 -1.75,0 ; -1.75,-0.5 -1.75,0 ; -1.75,0.5 -1.75,0 ; -1.25,0 -1.75,0 ; -0.5,0 0,0 ; 0,-0.5 0,0 ; 0,0.5 0,0 ; 0.5,0 0,0 ; 1.25,0 1.75,0 ; 1.75,-0.5 1.75,0 ; 1.75,0.5 1.75,0 ; 2.25,0 1.75,0
Mechanical 14:
  circle w0.1: c1.75,0 r0.8
  lines w0.1: -3.3,-2.3 -2.65,-2.3 ; -3.3,2 -2.15,2 -2.15,2.47 ccw(c-2.35,2.47) -2.35,2.67 ; -2.15,2.134 -3.3,2.134 -3.3,-2.434 -2.604,-2.434 ; -1.618,-0.132 -1.35,-0.4 ; -1.35,2.134 -0.2,2.134 -0.2,-2.434 -0.896,-2.434 ; -1.15,2.67 ccw(c-1.15,2.47) -1.35,2.47 -1.35,2 -0.2,2 ; -0.2,-2.3 -0.85,-2.3 ; 0.2,-2.3 0.85,-2.3 ; 0.2,2 1.35,2 1.35,2.47 ccw(c1.15,2.47) 1.15,2.67 ; 1.35,2.134 0.2,2.134 0.2,-2.434 0.896,-2.434 ; 1.882,-0.132 2.15,-0.4 ; 2.15,2.134 3.3,2.134 3.3,-2.434 2.604,-2.434 ; 2.35,2.67 ccw(c2.35,2.47) 2.15,2.47 2.15,2 3.3,2 ; 3.3,-2.3 2.65,-2.3 ; -2.65,-2.3 cw(c-1.75,-3.5) -0.85,-2.3 ; -2.65,-2.3 -2.604,-2.434 ; -2.604,-2.434 cw(c-1.75,-3.5) -0.896,-2.434 ; -2.15,-0.4 -1.89,-0.14 ; -2.15,-0.4 -2.15,0.4 ; -2.15,-0.4 -1.35,-0.4 ; -2.15,0.4 -1.89,0.14 ; -2.15,0.4 -1.35,0.4 ; -1.89,-0.14 -1.61,-0.14 -1.61,0.14 ; -1.89,-0.14 -1.89,0.14 ; -1.89,0.14 -1.61,0.14 ; -1.61,0.14 -1.35,0.4 ; -1.35,-0.4 -1.35,0.4 ; -0.896,-2.434 -0.85,-2.3 ; 0.85,-2.3 cw(c1.75,-3.5) 2.65,-2.3 ; 0.85,-2.3 0.896,-2.434 ; 0.896,-2.434 cw(c1.75,-3.5) 2.604,-2.434 ; 1.35,-0.4 1.61,-0.14 ; 1.35,-0.4 1.35,0.4 ; 1.35,-0.4 2.15,-0.4 ; 1.35,0.4 1.61,0.14 ; 1.35,0.4 2.15,0.4 ; 1.61,-0.14 1.89,-0.14 1.89,0.14 ; 1.61,-0.14 1.61,0.14 ; 1.61,0.14 1.89,0.14 ; 1.89,0.14 2.15,0.4 ; 2.15,-0.4 2.15,0.4 ; 2.604,-2.434 2.65,-2.3 ; -4.2,-3 -4.2,4.25 4.2,4.25 4.2,-3 -4.2,-3 ; -3.24,3.35 -3.005,2.67 -0.495,2.67 -0.26,3.35 -3.24,3.35 ; -2.25,-0.625 ccw(c-1.75,0) -2.25,0.625 -2.25,-0.624 ; 0.26,3.35 0.495,2.67 3.005,2.67 3.24,3.35 0.26,3.35
  text "1" at -5.225,2.8 h1.2
Drill Drawing:
  lines w0.1: -4.2,-3 4.2,-3 4.2,4.25 -4.2,4.25 -4.2,-3
  text "diam. 1.3mm" at -3.7,3.025 h0.8
  text "PRESS-FIT" at -2.925,-2.575 h0.8
  text "+0.09 -0.06" at -3.65,1.725 h0.8
3D body "PHOENIX_1911017.stp": height 9.2, standoff -3.8, extent -4.2,-3 4.2,4.25

## PHOENIX_1985807 [mm] "Terminal Block, 10A 63V, Pitch 3.5mm, 2 Positions, Screw Connection, Black Color"
height 8.5
pads (2):
  round 1.8 hole 1.1: 1(-1.75,0) 2(1.75,0)
Top Overlay:
  circle w0.2: c-1.75,-0.05 r1.45
  circle w0.2: c1.75,-0.05 r1.45
  lines w0.2: -3.75,-2.049 3.75,-2.049 ; -3.75,-1.566 3.75,-1.566 ; -3.75,1.487 3.75,1.487 ; -3.75,1.962 3.75,1.962 ; -3.75,-3.6 3.75,-3.6 3.75,3.7 -3.75,3.7 -3.75,-3.6
  text "1" at -1.95,2.375 h1
  text "2" at 1.45,2.375 h1
Mechanical 8:
  lines w0.1: -2.75,0 -1.75,0 ; -1.75,-1 -1.75,0 ; -1.75,1 -1.75,0 ; -1,0 0,0 ; -0.75,0 -1.75,0 ; 0,-1 0,0 ; 0,1 0,0 ; 0.75,0 1.75,0 ; 1,0 0,0 ; 1.75,-1 1.75,0 ; 1.75,1 1.75,0 ; 2.75,0 1.75,0
Mechanical 14:
  circle w0.1: c-1.75,-0.05 r1.45
  circle w0.1: c1.75,-0.05 r1.45
  circle w0.1: c-1.75,-0.05 r1.4
  circle w0.1: c1.75,-0.05 r1.4
  lines w0.1: -3.75,-2.049 3.75,-2.049 ; -3.75,-1.566 3.75,-1.566 ; -3.75,1.487 3.75,1.487 ; -3.75,1.962 3.75,1.962 ; -2.956,-0.761 -1.039,1.156 ; -2.461,-1.256 -0.544,0.661 ; 0.544,-0.761 2.461,1.156 ; 1.039,-1.256 2.956,0.661 ; -3.75,-3.6 3.75,-3.6 3.75,3.7 -3.75,3.7 -3.75,-3.6
3D body "PHOENIX_1985807.stp": height 8.5, standoff -3.5, extent -3.75,-3.6 3.75,3.7

## PHOENIX_1985807 - duplicate [mm] "Terminal Block, 10A 63V, Pitch 3.5mm, 2 Positions, Screw Connection, Black Color"
height 8.5
pads (2):
  round 1.8 hole 1.1: 1(-1.75,0) 2(1.75,0)
Top Overlay:
  circle w0.2: c1.75,-0.05 r1.45
  circle w0.2: c-1.75,-0.05 r1.45
  lines w0.2: -3.75,-2.049 3.75,-2.049 ; -3.75,-1.566 3.75,-1.566 ; -3.75,1.487 3.75,1.487 ; -3.75,1.962 3.75,1.962 ; -3.75,-3.6 -3.75,3.7 3.75,3.7 3.75,-3.6 -3.75,-3.6
  text "2" at 1.45,2.375 h1
  text "1" at -1.95,2.375 h1
Mechanical 8:
  lines w0.1: -2.75,0 -1.75,0 ; -1.75,-1 -1.75,0 ; -1.75,1 -1.75,0 ; -1,0 0,0 ; -0.75,0 -1.75,0 ; 0,-1 0,0 ; 0,1 0,0 ; 0.75,0 1.75,0 ; 1,0 0,0 ; 1.75,-1 1.75,0 ; 1.75,1 1.75,0 ; 2.75,0 1.75,0
Mechanical 14:
  circle w0.1: c1.75,-0.05 r1.4
  circle w0.1: c-1.75,-0.05 r1.4
  circle w0.1: c1.75,-0.05 r1.45
  circle w0.1: c-1.75,-0.05 r1.45
  lines w0.1: -3.75,-2.049 3.75,-2.049 ; -3.75,-1.566 3.75,-1.566 ; -3.75,1.487 3.75,1.487 ; -3.75,1.962 3.75,1.962 ; -2.956,-0.761 -1.039,1.156 ; -2.461,-1.256 -0.544,0.661 ; 0.544,-0.761 2.461,1.156 ; 1.039,-1.256 2.956,0.661 ; -3.75,-3.6 -3.75,3.7 3.75,3.7 3.75,-3.6 -3.75,-3.6
3D body "PHOENIX_1985807.stp": height 8.5, standoff -3.5, extent -3.75,-3.6 3.75,3.7

## PLD-4-2 [mm] "Connector; Header; 2x2 Position"
height 6
pads (4):
  rect 1.2x1.2 hole 0.75: 1(0,0)
  round 1.2 hole 0.75: 2(0,2) 3(2,0) 4(2,2)
Top Overlay:
  lines w0.2: -1,-1.3 3,-1.3 3,3.3 -1,3.3 -1,-1.3
3D body "pld-2mm.stp": height 5.5, standoff -2.5, extent -1,-1.3 1,3.3
3D body "pld-2mm.stp": height 5.5, standoff -2.5, extent 1,-1.3 3,3.3

## PLD-4-3D [mm] "Connector; Header; 2x2 Position"
height 7.5
pads (4):
  rect 1.5x1.5 hole 0.9: 1(0,0)
  round 1.5 hole 0.9: 2(0,2.54) 3(2.54,0) 4(2.54,2.54)
Top Overlay:
  lines w0.2: -1.27,-1.27 3.81,-1.27 3.81,3.81 -1.27,3.81 -1.27,-1.27
3D body "PLD-4.step": height 8.4, standoff -3, extent -1.27,-1.23 3.81,3.77

## PLD-4RL1 [mm] "Connector; Header; 2x2 Position"
height 7
pads (4):
  rect 1.5x1.5 hole 0.9: 1(0,0)
  round 1.5 hole 0.9: 2(0,2.54) 3(2.54,0) 4(2.54,2.54)
Top Overlay:
  lines w0.2: -0.423,-2.54 -0.423,-5.927 0,-6.35 0.423,-5.927 0.423,-2.54 ; 2.117,-2.54 2.117,-5.927 2.54,-6.35 2.963,-5.927 2.963,-2.54 ; -1.27,3.81 -1.27,-2.54 3.81,-2.54 3.81,3.81 ; -1.27,3.81 -1.27,-1.27 3.81,-1.27 3.81,3.81 ; -1.27,3.81 3.81,3.81
3D body "PLS-1R.step": height 5.45, standoff -3, extent 1.27,-7.35 3.81,1.27
3D body "PLS-1Rr.stp": height 7.99, standoff -3, extent 1.27,-7.35 3.81,3.81
3D body "PLS-1Rr.stp": height 7.99, standoff -3, extent -1.27,-7.35 1.27,3.81
3D body "PLS-1R.step": height 5.45, standoff -3, extent -1.27,-7.35 1.27,1.27

## PLD-4RL2 [mm] "Connector; Header; 2x2 Position"
height 5
pads (4):
  rect 1.5x1.5 hole 0.9: 1(0,0)
  round 1.5 hole 0.9: 2(0,2.54) 3(2.54,0) 4(2.54,2.54)
Top Overlay:
  lines w0.2: -0.423,-4.318 -0.423,-9.737 0,-10.16 0.423,-9.737 0.423,-4.318 ; 2.117,-4.318 2.117,-9.737 2.54,-10.16 2.963,-9.737 2.963,-4.318 ; -1.27,-1.27 -1.27,-4.318 3.81,-4.318 3.81,-1.27 ; -1.27,-1.27 3.81,-1.27 ; -1.27,-1.27 -1.27,3.81 3.81,3.81 3.81,-1.27
3D body "PLD-R2.stp": height 5.08, standoff -2.6, extent 1.27,-9.976 3.81,2.864
3D body "PLD-R2.stp": height 5.08, standoff -2.6, extent -1.27,-9.976 1.27,2.864

## PLD-4RR1 [mm] "Connector; Header; 2x2 Position"
height 7
pads (4):
  rect 1.5x1.5 hole 0.9: 1(0,0)
  round 1.5 hole 0.9: 2(0,2.54) 3(2.54,0) 4(2.54,2.54)
Top Overlay:
  lines w0.2: -0.423,5.08 -0.423,8.467 0,8.89 0.423,8.467 0.423,5.08 ; 2.117,5.08 2.117,8.467 2.54,8.89 2.963,8.467 2.963,5.08 ; -1.27,3.81 -1.27,-1.27 3.81,-1.27 3.81,3.81 ; -1.27,3.81 3.81,3.81 ; -1.27,3.81 -1.27,5.08 3.81,5.08 3.81,3.81
3D body "PLS-1R.step": height 5.45, standoff -3, extent -1.27,1.27 1.27,9.89
3D body "PLS-1Rr.stp": height 7.99, standoff -3, extent -1.27,-1.27 1.27,9.89
3D body "PLS-1Rr.stp": height 7.99, standoff -3, extent 1.27,-1.27 3.81,9.89
3D body "PLS-1R.step": height 5.45, standoff -3, extent 1.27,1.27 3.81,9.89

## PLD-4RR2 [mm] "Connector; Header; 2x2 Position"
height 5
pads (4):
  rect 1.5x1.5 hole 0.9: 1(0,0)
  round 1.5 hole 0.9: 2(0,2.54) 3(2.54,0) 4(2.54,2.54)
Top Overlay:
  lines w0.2: -0.423,6.858 -0.423,12.277 0,12.7 0.423,12.277 0.423,6.858 ; 2.117,6.858 2.117,12.277 2.54,12.7 2.963,12.277 2.963,6.858 ; -1.27,3.81 -1.27,-1.27 3.81,-1.27 3.81,3.81 ; -1.27,3.81 3.81,3.81 ; -1.27,3.81 -1.27,6.858 3.81,6.858 3.81,3.81
3D body "PLD-R2.stp": height 5.08, standoff -2.6, extent -1.27,-0.324 1.27,12.516
3D body "PLD-R2.stp": height 5.08, standoff -2.6, extent 1.27,-0.324 3.81,12.516